# Altium footprint library Components.PcbLib: 260 footprints (part 16 of 17)
Each footprint in its own frame and in the unit in brackets; x right, y up, seen from the top. Pads: shape width x height; smd on the part's side, far side on the other; paste and mask are expansions set on the pad; w line width, h text height; cw(c..) or ccw(c..) is an arc to the next point about the centre after c.
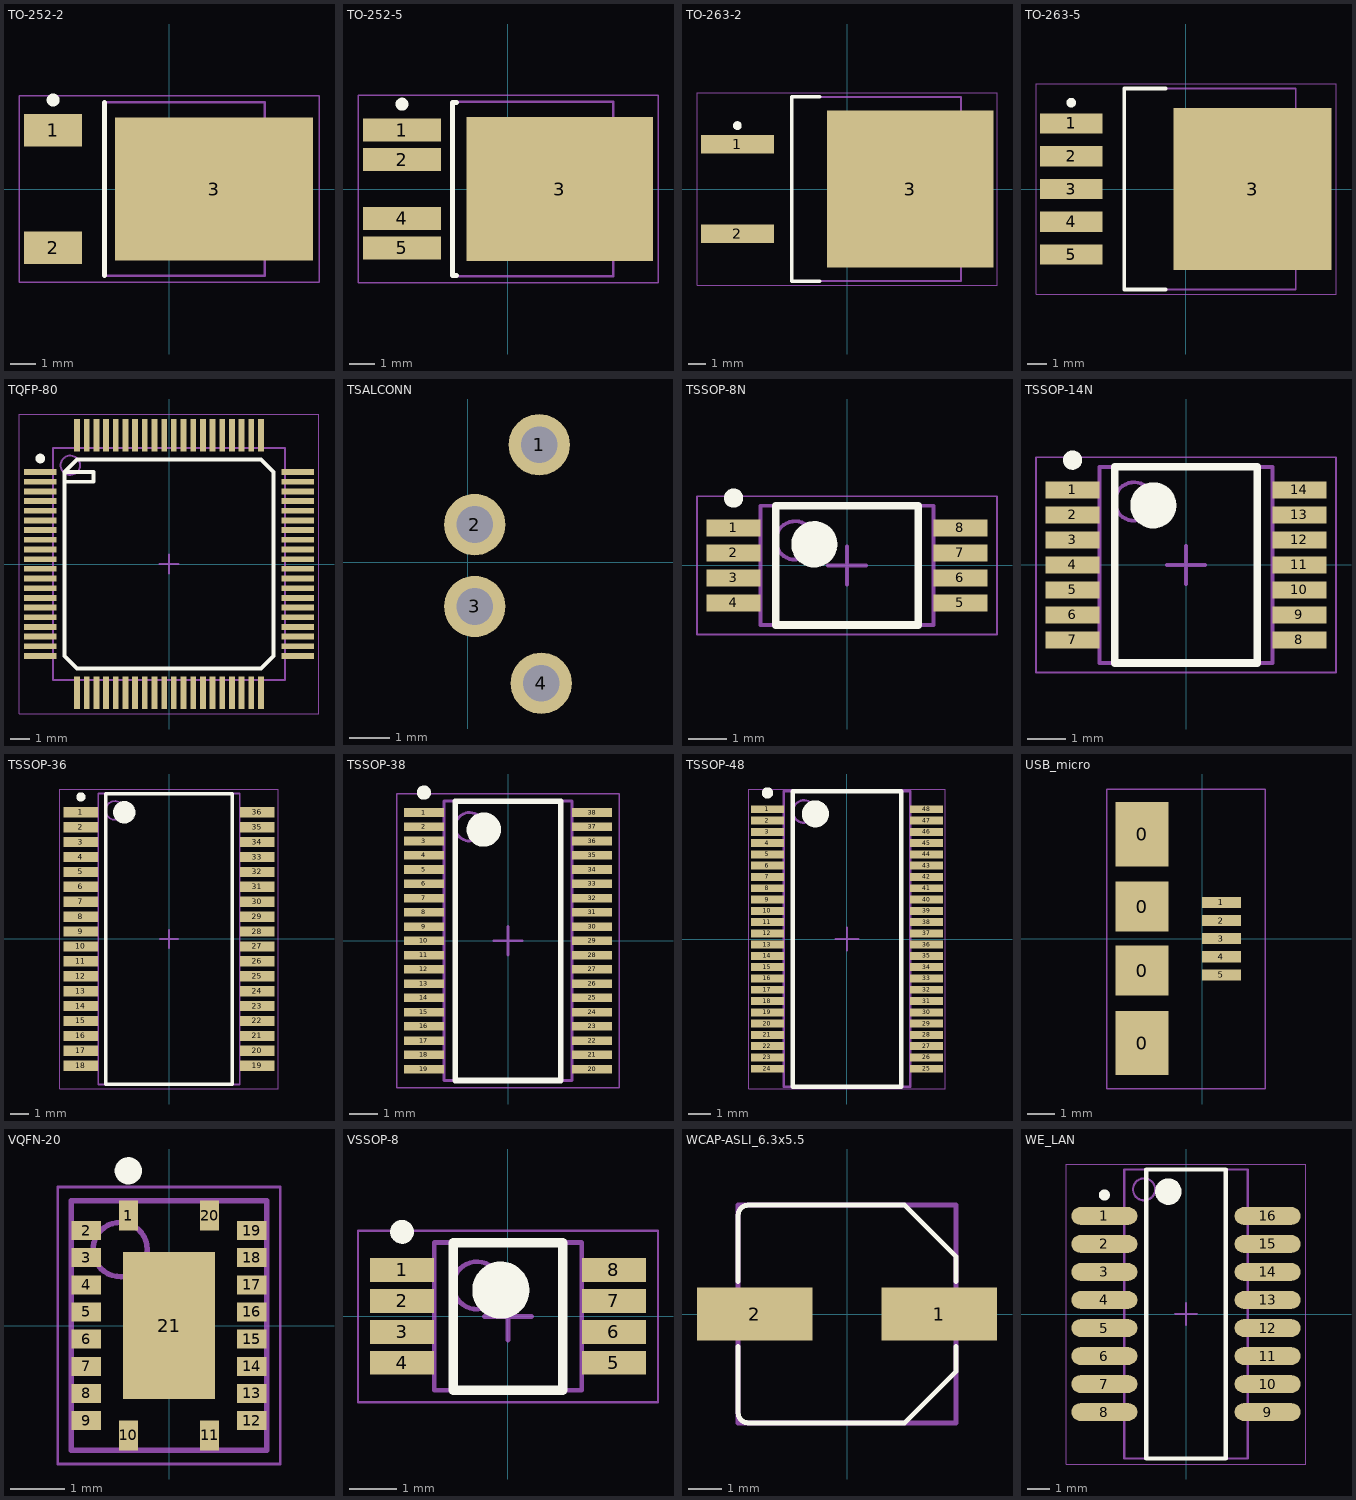
[diagram p15: the footprints below, top view; thin cyan lines are the x and y axes]

## TO-252-2 [mm] "D-PAK, 3-Pads, Body 6,21x6,73mm (max), IPC Medium Density"
height 2.38
pads (3):
  rect 2.25x1.25 smd: 1(-4.5,2.28) 2(-4.5,-2.28)
  rect 7.7x5.55 smd: 3(1.75,0)
Top Overlay:
  circle w0.25: c-4.5,3.455 r0.125
  lines w0.2: -2.5,-3.35 -2.5,3.35
Mechanical 13:
  lines w0.1: -2.5,-3.375 -2.5,3.375 3.72,3.375 3.72,-3.375 -2.5,-3.375
Mechanical 15:
  lines w0.05: -5.825,-3.625 -5.825,3.625 5.825,3.625 5.825,-3.625 -5.825,-3.625
  lines w0.1: -0.5,0 0.5,0 ; 0,-0.5 0,0.5
3D body "DPAK.step": height 2.37, standoff -0.03, extent -5.207,-3.367 4.893,3.367

## TO-252-5 [mm]
height 2.39
pads (5):
  rect 3x0.9 smd: 1(-4.1,2.28) 2(-4.1,1.14) 4(-4.1,-1.14) 5(-4.1,-2.28)
  rect 7.2x5.55 smd: 3(2,0)
Top Overlay:
  circle w0.25: c-4.1,3.28 r0.125
  lines w0.2: -2,-3.35 -2.15,-3.35 -2.15,3.35 -2,3.35
Mechanical 13:
  lines w0.1: -2.15,-3.375 4.07,-3.375 4.07,3.375 -2.15,3.375 -2.15,-3.375
Mechanical 15:
  lines w0.05: -5.8,-3.625 5.8,-3.625 5.8,3.625 -5.8,3.625 -5.8,-3.625
  lines w0.1: -0.5,0 0.5,0 ; 0,-0.5 0,0.5
3D body "DPAK-5.STEP": height 2.3, standoff 0, extent -4.7,-3.25 5.2,3.25

## TO-263-2 [mm]
height 4.8
pads (3):
  rect 4.15x1.05 smd: 1(-6.25,2.54) 2(-6.25,-2.54)
  rect 9.5x8.95 smd: 3(3.6,0)
Top Overlay:
  circle w0.25: c-6.25,3.615 r0.125
  lines w0.2: -1.55,-5.25 -3.15,-5.25 -3.15,5.25 -1.55,5.25
Mechanical 13:
  lines w0.1: -3.15,-5.25 -3.15,5.25 6.5,5.25 6.5,-5.25 -3.15,-5.25
Mechanical 15:
  lines w0.05: -8.55,-5.5 -8.55,5.5 8.55,5.5 8.55,-5.5 -8.55,-5.5
  lines w0.1: -0.5,0 0.5,0 ; 0,-0.5 0,0.5
3D body "D2PAK.step": height 4.92, standoff -0.09, extent -7.765,-5.08 7.499,5.08

## TO-263-5 [mm]
height 4.65
pads (6):
  rect 3.25x1.05 smd: 1(-5.95,3.4) 2(-5.95,1.7) 3(-5.95,0) 4(-5.95,-1.7) 5(-5.95,-3.4)
  rect 8.2x8.4 smd: 3(3.45,0)
Top Overlay:
  circle w0.25: c-5.95,4.475 r0.125
  lines w0.2: -1.05,-5.2 -3.2,-5.2 -3.2,5.2 -1.05,5.2
Mechanical 13:
  lines w0.1: -3.2,-5.2 -3.2,5.2 5.69,5.2 5.69,-5.2 -3.2,-5.2
Mechanical 15:
  lines w0.05: -7.775,-5.45 -7.775,5.45 7.775,5.45 7.775,-5.45 -7.775,-5.45
  lines w0.1: -0.5,0 0.5,0 ; 0,-0.5 0,0.5
3D body "D2PAK-5.STEP": height 4.88, standoff 0.08, extent -7.515,-5 8.155,5

## TQFP-80 [mm] "TQFP, 80-Leads, Body 14,00x14,00mm, Pitch 0,50mm, IPC Medium Density"
height 1.2
pads (80):
  rect 1.7x0.3 smd: 1(-6.65,4.75) 2(-6.65,4.25) 3(-6.65,3.75) 4(-6.65,3.25) 5(-6.65,2.75) 6(-6.65,2.25) 7(-6.65,1.75) 8(-6.65,1.25) 9(-6.65,0.75) 10(-6.65,0.25) 11(-6.65,-0.25) 12(-6.65,-0.75) 13(-6.65,-1.25) 14(-6.65,-1.75) 15(-6.65,-2.25) 16(-6.65,-2.75) 17(-6.65,-3.25) 18(-6.65,-3.75) 19(-6.65,-4.25) 20(-6.65,-4.75) 41(6.65,-4.75) 42(6.65,-4.25) 43(6.65,-3.75) 44(6.65,-3.25) 45(6.65,-2.75) 46(6.65,-2.25) 47(6.65,-1.75) 48(6.65,-1.25) 49(6.65,-0.75) 50(6.65,-0.25) 51(6.65,0.25) 52(6.65,0.75) 53(6.65,1.25) 54(6.65,1.75) 55(6.65,2.25) 56(6.65,2.75) 57(6.65,3.25) 58(6.65,3.75) 59(6.65,4.25) 60(6.65,4.75)
  rect 0.3x1.7 smd: 21(-4.75,-6.65) 22(-4.25,-6.65) 23(-3.75,-6.65) 24(-3.25,-6.65) 25(-2.75,-6.65) 26(-2.25,-6.65) 27(-1.75,-6.65) 28(-1.25,-6.65) 29(-0.75,-6.65) 30(-0.25,-6.65) 31(0.25,-6.65) 32(0.75,-6.65) 33(1.25,-6.65) 34(1.75,-6.65) 35(2.25,-6.65) 36(2.75,-6.65) 37(3.25,-6.65) 38(3.75,-6.65) 39(4.25,-6.65) 40(4.75,-6.65) 61(4.75,6.65) 62(4.25,6.65) 63(3.75,6.65) 64(3.25,6.65) 65(2.75,6.65) 66(2.25,6.65) 67(1.75,6.65) 68(1.25,6.65) 69(0.75,6.65) 70(0.25,6.65) 71(-0.25,6.65) 72(-0.75,6.65) 73(-1.25,6.65) 74(-1.75,6.65) 75(-2.25,6.65) 76(-2.75,6.65) 77(-3.25,6.65) 78(-3.75,6.65) 79(-4.25,6.65) 80(-4.75,6.65)
Top Overlay:
  circle w0.25: c-6.65,5.45 r0.125
  lines w0.2: -5.4,4.25 -3.9,4.25 -3.9,4.75 -5.4,4.75 ; -5.4,4.75 -5.4,-4.75 -4.75,-5.4 4.75,-5.4 5.4,-4.75 5.4,4.75 4.75,5.4 -4.75,5.4 -5.4,4.75
Mechanical 13:
  circle w0.1: c-5.1,5.1 r0.5
  lines w0.1: -6,-6 -6,6 6,6 6,-6 -6,-6
Mechanical 15:
  lines w0.05: -7.75,-7.75 -7.75,7.75 7.75,7.75 7.75,-7.75 -7.75,-7.75
  lines w0.1: -0.5,0 0.5,0 ; 0,-0.5 0,0.5
3D body "User Library-QFP50P1400X1400X160-80N.STEP": height 1.6, standoff 0, extent -7.1,-7.1 7.1,7.1

## TSALCONN [mm]
pads (4):
  round 1.5 hole 0.9: 1(1.75,2.875) 2(0.175,0.925) 3(0.175,-1.075) 4(1.8,-2.95)

## TSSOP-8N [mm] "TSOP, 8-Leads, Body 3,00x4,40mm, Pitch 0,65mm, IPC Medium Density"
height 1.2
pads (8):
  rect 1.4x0.45 smd: 1(-2.95,0.975) 2(-2.95,0.325) 3(-2.95,-0.325) 4(-2.95,-0.975) 5(2.95,-0.975) 6(2.95,-0.325) 7(2.95,0.325) 8(2.95,0.975)
Top Overlay:
  circle w0.6: c-0.85,0.55 r0.3
  circle w0.25: c-2.95,1.75 r0.125
  lines w0.2: -1.85,-1.55 1.85,-1.55 1.85,1.55 -1.85,1.55 -1.85,-1.55
Mechanical 13:
  circle w0.1: c-1.35,0.65 r0.5
  lines w0.1: -2.25,-1.55 2.25,-1.55 2.25,1.55 -2.25,1.55 -2.25,-1.55
Mechanical 15:
  lines w0.05: -3.9,-1.8 3.9,-1.8 3.9,1.8 -3.9,1.8 -3.9,-1.8
  lines w0.1: -0.5,0 0.5,0 ; 0,-0.5 0,0.5
3D body: height 1.2, standoff 0.1, extent -2.25,-1.55 2.25,1.55

## TSSOP-14N [mm] "TSOP, 14-Leads, Body 5,00x4,40mm, Pitch 0,65mm, IPC Medium Density"
height 1.2
pads (14):
  rect 1.4x0.45 smd: 1(-2.95,1.95) 2(-2.95,1.3) 3(-2.95,0.65) 4(-2.95,0) 5(-2.95,-0.65) 6(-2.95,-1.3) 7(-2.95,-1.95) 8(2.95,-1.95) 9(2.95,-1.3) 10(2.95,-0.65) 11(2.95,0) 12(2.95,0.65) 13(2.95,1.3) 14(2.95,1.95)
Top Overlay:
  circle w0.6: c-0.85,1.55 r0.3
  circle w0.25: c-2.95,2.725 r0.125
  lines w0.2: -1.85,-2.55 1.85,-2.55 1.85,2.55 -1.85,2.55 -1.85,-2.55
Mechanical 13:
  circle w0.1: c-1.35,1.65 r0.5
  lines w0.1: -2.25,-2.55 2.25,-2.55 2.25,2.55 -2.25,2.55 -2.25,-2.55
Mechanical 15:
  lines w0.05: -3.9,-2.8 3.9,-2.8 3.9,2.8 -3.9,2.8 -3.9,-2.8
  lines w0.1: -0.5,0 0.5,0 ; 0,-0.5 0,0.5
3D body: height 1.2, standoff 0.05, extent -2.25,-2.55 2.25,2.55

## TSSOP-36 [mm]
height 2.64
pads (36):
  rect 1.85x0.55 smd: 1(-4.725,6.8) 2(-4.725,6) 3(-4.725,5.2) 4(-4.725,4.4) 5(-4.725,3.6) 6(-4.725,2.8) 7(-4.725,2) 8(-4.725,1.2) 9(-4.725,0.4) 10(-4.725,-0.4) 11(-4.725,-1.2) 12(-4.725,-2) 13(-4.725,-2.8) 14(-4.725,-3.6) 15(-4.725,-4.4) 16(-4.725,-5.2) 17(-4.725,-6) 18(-4.725,-6.8) 19(4.725,-6.8) 20(4.725,-6) 21(4.725,-5.2) 22(4.725,-4.4) 23(4.725,-3.6) 24(4.725,-2.8) 25(4.725,-2) 26(4.725,-1.2) 27(4.725,-0.4) 28(4.725,0.4) 29(4.725,1.2) 30(4.725,2) 31(4.725,2.8) 32(4.725,3.6) 33(4.725,4.4) 34(4.725,5.2) 35(4.725,6) 36(4.725,6.8)
Top Overlay:
  circle w0.6: c-2.4,6.8 r0.3
  circle w0.25: c-4.725,7.625 r0.125
  lines w0.2: -3.4,-7.8 3.4,-7.8 3.4,7.8 -3.4,7.8 -3.4,-7.8
Mechanical 13:
  circle w0.1: c-2.9,6.9 r0.5
  lines w0.1: -3.8,-7.8 3.8,-7.8 3.8,7.8 -3.8,7.8 -3.8,-7.8
Mechanical 15:
  lines w0.05: -5.875,-8.05 5.875,-8.05 5.875,8.05 -5.875,8.05 -5.875,-8.05
  lines w0.1: -0.5,0 0.5,0 ; 0,-0.5 0,0.5
3D body "TSSOP-36.STEP": height 2.64, standoff 0, extent -5.25,-7.77 5.25,7.77

## TSSOP-38 [mm]
height 1.2
pads (38):
  rect 1.4x0.3 smd: 1(-2.95,4.5) 2(-2.95,4) 3(-2.95,3.5) 4(-2.95,3) 5(-2.95,2.5) 6(-2.95,2) 7(-2.95,1.5) 8(-2.95,1) 9(-2.95,0.5) 10(-2.95,0) 11(-2.95,-0.5) 12(-2.95,-1) 13(-2.95,-1.5) 14(-2.95,-2) 15(-2.95,-2.5) 16(-2.95,-3) 17(-2.95,-3.5) 18(-2.95,-4) 19(-2.95,-4.5) 20(2.95,-4.5) 21(2.95,-4) 22(2.95,-3.5) 23(2.95,-3) 24(2.95,-2.5) 25(2.95,-2) 26(2.95,-1.5) 27(2.95,-1) 28(2.95,-0.5) 29(2.95,0) 30(2.95,0.5) 31(2.95,1) 32(2.95,1.5) 33(2.95,2) 34(2.95,2.5) 35(2.95,3) 36(2.95,3.5) 37(2.95,4) 38(2.95,4.5)
Top Overlay:
  circle w0.25: c-2.95,5.2 r0.125
  circle w0.6: c-0.85,3.9 r0.3
  lines w0.2: -1.85,-4.9 -1.85,4.9 1.85,4.9 1.85,-4.9 -1.85,-4.9
Mechanical 13:
  circle w0.1: c-1.35,4 r0.5
  lines w0.1: -2.25,-4.9 -2.25,4.9 2.25,4.9 2.25,-4.9 -2.25,-4.9
Mechanical 15:
  lines w0.05: -3.9,-5.15 -3.9,5.15 3.9,5.15 3.9,-5.15 -3.9,-5.15
  lines w0.1: -0.5,0 0.5,0 ; 0,-0.5 0,0.5
3D body "TSSOP-38.STEP": height 0.97, standoff -0.02, extent -3.175,-4.85 3.225,4.85

## TSSOP-48 [mm]
height 2
pads (48):
  rect 1.45x0.35 smd: 1(-3.525,5.75) 2(-3.525,5.25) 3(-3.525,4.75) 4(-3.525,4.25) 5(-3.525,3.75) 6(-3.525,3.25) 7(-3.525,2.75) 8(-3.525,2.25) 9(-3.525,1.75) 10(-3.525,1.25) 11(-3.525,0.75) 12(-3.525,0.25) 13(-3.525,-0.25) 14(-3.525,-0.75) 15(-3.525,-1.25) 16(-3.525,-1.75) 17(-3.525,-2.25) 18(-3.525,-2.75) 19(-3.525,-3.25) 20(-3.525,-3.75) 21(-3.525,-4.25) 22(-3.525,-4.75) 23(-3.525,-5.25) 24(-3.525,-5.75) 25(3.525,-5.75) 26(3.525,-5.25) 27(3.525,-4.75) 28(3.525,-4.25) 29(3.525,-3.75) 30(3.525,-3.25) 31(3.525,-2.75) 32(3.525,-2.25) 33(3.525,-1.75) 34(3.525,-1.25) 35(3.525,-0.75) 36(3.525,-0.25) 37(3.525,0.25) 38(3.525,0.75) 39(3.525,1.25) 40(3.525,1.75) 41(3.525,2.25) 42(3.525,2.75) 43(3.525,3.25) 44(3.525,3.75) 45(3.525,4.25) 46(3.525,4.75) 47(3.525,5.25) 48(3.525,5.75)
Top Overlay:
  circle w0.25: c-3.525,6.475 r0.125
  circle w0.6: c-1.4,5.55 r0.3
  lines w0.2: -2.4,-6.55 -2.4,6.55 2.4,6.55 2.4,-6.55 -2.4,-6.55
Mechanical 13:
  circle w0.1: c-1.9,5.65 r0.5
  lines w0.1: -2.8,-6.55 -2.8,6.55 2.8,6.55 2.8,-6.55 -2.8,-6.55
Mechanical 15:
  lines w0.05: -4.35,-6.65 -4.35,6.65 4.35,6.65 4.35,-6.65 -4.35,-6.65
  lines w0.1: -0.5,0 0.5,0 ; 0,-0.5 0,0.5
3D body "TSSOP-48.step": height 1.1, standoff 0, extent -4.05,-6.25 4.05,6.25

## USB_micro [mm]
pads (9):
  rect 1.9x2.3 smd: 0(-2.15,-3.75) 0(-2.15,3.75)
  rect 1.9x1.8 smd: 0(-2.15,-1.15) 0(-2.15,1.15)
  rect 1.4x0.4 smd: 1(0.7,1.3) 2(0.7,0.65) 3(0.7,0) 4(0.7,-0.65) 5(0.7,-1.3)
Mechanical 15:
  lines w0.05: -3.425,-5.4 2.275,-5.4 2.275,5.375 -3.425,5.375 -3.425,-5.4
3D body "USB_Micro.step": height 2.7, standoff -0.24, extent -4.705,-4 0.725,3.98

## VQFN-20 [mm] "VQFN, 20-Leads, Body 3,50x4,50mm, IPC Medium Density"
height 1
pads (21):
  rect 0.35x0.55 smd: 1(-0.75,2.025) 10(-0.75,-2.025) 11(0.75,-2.025) 20(0.75,2.025)
  rect 0.55x0.35 smd: 2(-1.525,1.75) 3(-1.525,1.25) 4(-1.525,0.75) 5(-1.525,0.25) 6(-1.525,-0.25) 7(-1.525,-0.75) 8(-1.525,-1.25) 9(-1.525,-1.75) 12(1.525,-1.75) 13(1.525,-1.25) 14(1.525,-0.75) 15(1.525,-0.25) 16(1.525,0.25) 17(1.525,0.75) 18(1.525,1.25) 19(1.525,1.75)
  rect 1.7x2.7 smd: 21(0,0)
Top Overlay:
  circle w0.25: c-0.75,2.85 r0.125
Mechanical 13:
  circle w0.1: c-0.9,1.4 r0.5
  lines w0.1: -1.8,-2.3 1.8,-2.3 1.8,2.3 -1.8,2.3 -1.8,-2.3
Mechanical 15:
  lines w0.05: -2.05,-2.55 2.05,-2.55 2.05,2.55 -2.05,2.55 -2.05,-2.55
  lines w0.1: -0.5,0 0.5,0 ; 0,-0.5 0,0.5
3D body: height 1, standoff 0.08, extent -1.8,-2.3 1.8,2.3

## VSSOP-8 [mm]
height 1.1
pads (8):
  rect 1.35x0.5 smd: 1(-2.225,0.975) 2(-2.225,0.325) 3(-2.225,-0.325) 4(-2.225,-0.975) 5(2.225,-0.975) 6(2.225,-0.325) 7(2.225,0.325) 8(2.225,0.975)
Top Overlay:
  circle w0.6: c-0.15,0.55 r0.3
  circle w0.25: c-2.225,1.775 r0.125
  lines w0.2: -1.15,-1.55 1.15,-1.55 1.15,1.55 -1.15,1.55 -1.15,-1.55
Mechanical 13:
  circle w0.1: c-0.65,0.65 r0.5
  lines w0.1: -1.55,-1.55 1.55,-1.55 1.55,1.55 -1.55,1.55 -1.55,-1.55
Mechanical 15:
  lines w0.05: -3.15,-1.8 3.15,-1.8 3.15,1.8 -3.15,1.8 -3.15,-1.8
  lines w0.1: -0.5,0 0.5,0 ; 0,-0.5 0,0.5
3D body "VSSOP-8.step": height 1.09, standoff -0.01, extent -2.5,-1.5 2.5,1.5

## WCAP-ASLI_6.3x5.5 [mm] "Aluminium Electrolytic V-Chip SMT Capacitors, Ф6.3x5.5mm"
height 5.5
pads (2):
  rect 3.5x1.6 smd: 1(2.8,0) 2(-2.8,0)
Top Overlay:
  lines w0.15: -3.3,-3 ccw(c-3,-3) -3,-3.3 1.75,-3.3 3.3,-1.75 3.3,-0.98 ; -3.3,-2.99 -3.3,-0.98 ; -3.3,0.98 -3.3,2.99 ; -3.3,3 cw(c-3,3) -3,3.3 1.75,3.3 3.3,1.75 3.3,0.98
Mechanical 13:
  lines w0.15: -3.3,-3.3 3.3,-3.3 3.3,3.3 -3.3,3.3 -3.3,-3.3
3D body "6.3x5.5x2.2.stp": height 5.5, standoff 0, extent -3.65,-3.3 3.65,3.3

## WE_LAN [mm] "SOP, 16-Leads, Body 12,80x5,30mm, Pitch 1,27mm, IPC Medium Density"
height 6
pads (16):
  oval 3x0.8 smd: 1(-3.7,4.445) 2(-3.7,3.175) 3(-3.7,1.905) 4(-3.7,0.635) 5(-3.7,-0.635) 6(-3.7,-1.905) 7(-3.7,-3.175) 8(-3.7,-4.445) 9(3.7,-4.445) 10(3.7,-3.175) 11(3.7,-1.905) 12(3.7,-0.635) 13(3.7,0.635) 14(3.7,1.905) 15(3.7,3.175) 16(3.7,4.445)
Top Overlay:
  circle w0.25: c-3.7,5.395 r0.125
  circle w0.6: c-0.8,5.55 r0.3
  lines w0.2: -1.8,-6.55 -1.8,6.55 1.8,6.55 1.8,-6.55 -1.8,-6.55
Mechanical 13:
  circle w0.1: c-1.9,5.65 r0.5
  lines w0.1: -2.8,-6.55 -2.8,6.55 2.8,6.55 2.8,-6.55 -2.8,-6.55
Mechanical 15:
  lines w0.05: -5.425,-6.8 -5.425,6.8 5.425,6.8 5.425,-6.8 -5.425,-6.8
  lines w0.1: -0.5,0 0.5,0 ; 0,-0.5 0,0.5
3D body "7490100111A.stp": height 6.3, standoff -0.05, extent -4.7,-6.35 4.7,6.35